# Altium footprint library HoangLong_Library.PcbLib: 81 footprints (part 4 of 6)
Each footprint in its own frame and in the unit in brackets; x right, y up, seen from the top. Pads: shape width x height; smd on the part's side, far side on the other; paste and mask are expansions set on the pad; w line width, h text height; cw(c..) or ccw(c..) is an arc to the next point about the centre after c.
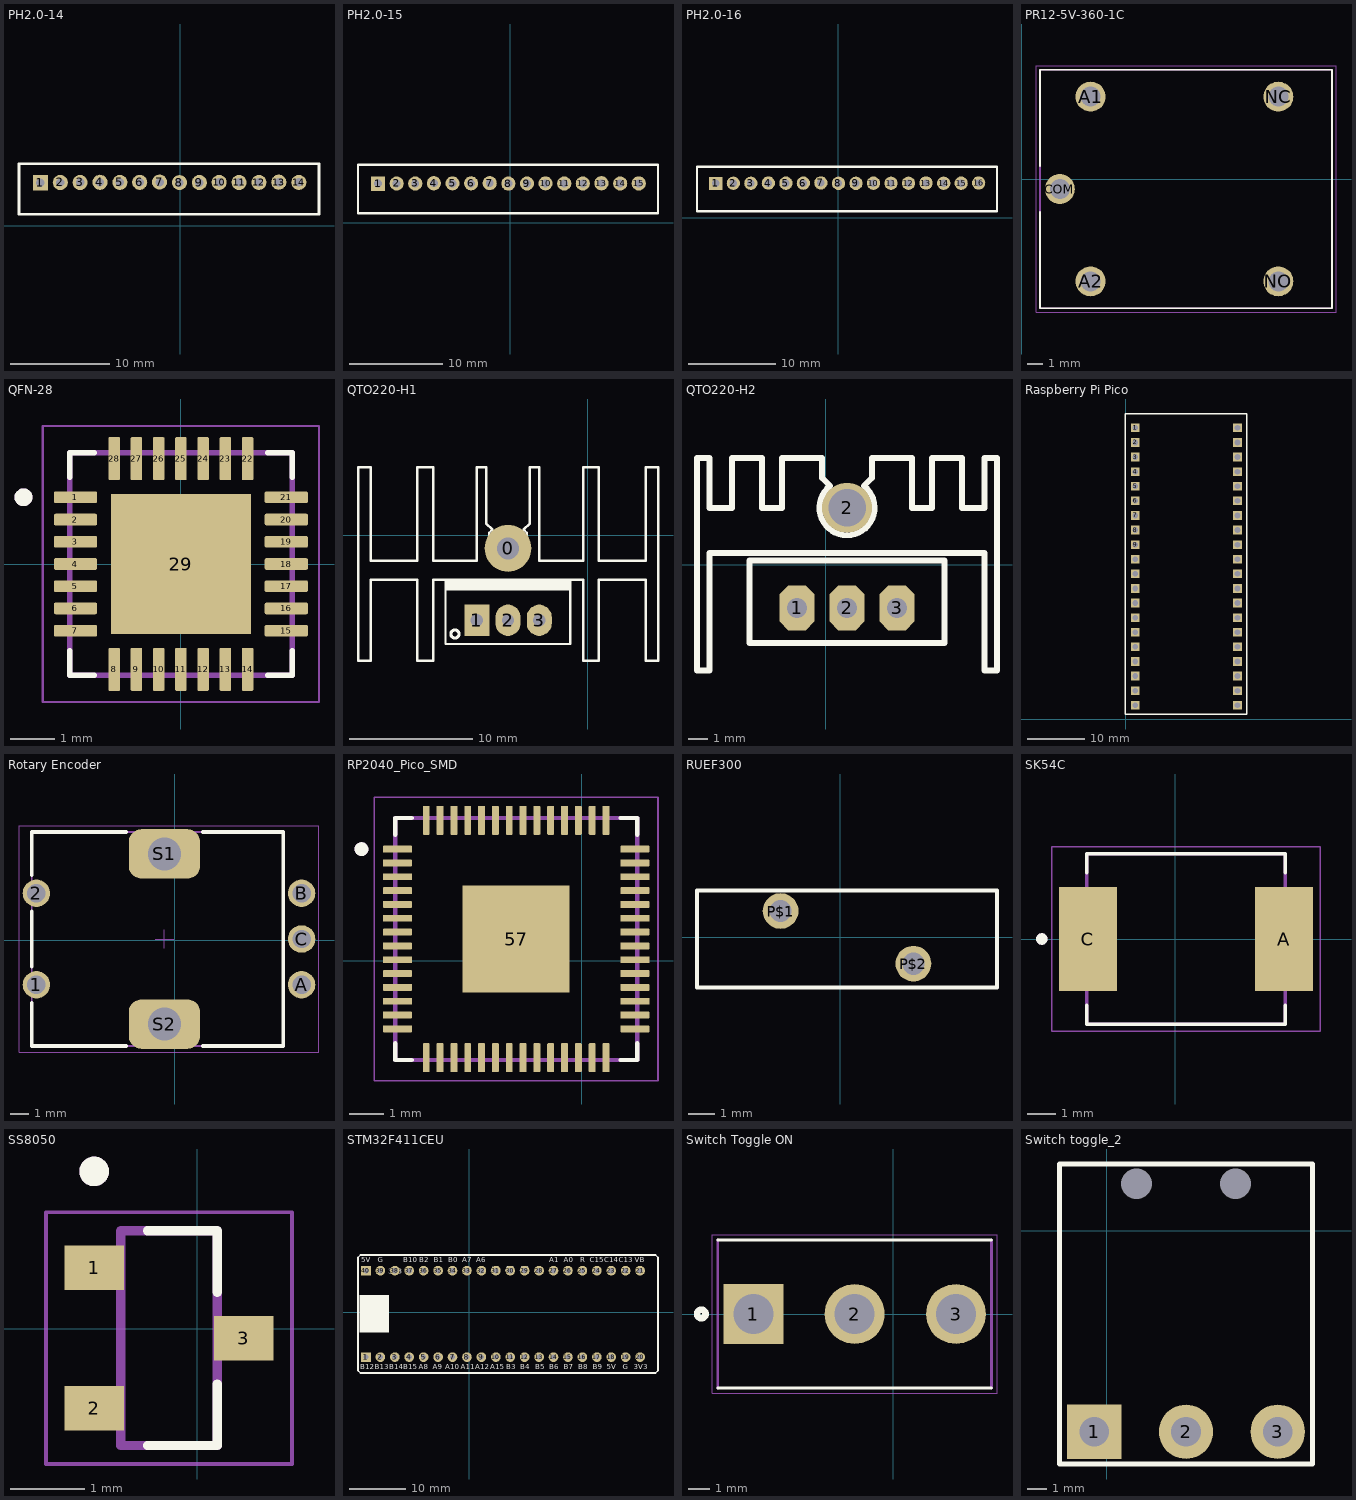
[diagram p3: the footprints below, top view; thin cyan lines are the x and y axes]

## PH2.0-14 [mil]
pads (14):
  rect 60x60 hole 33.46: 1(-555,170)
  round 60 hole 33.46: 2(-476.27,170.82) 3(-397.6,170.93) 4(-318.87,171.75) 5(-239.84,171.37) 6(-161.18,171.48) 7(-82.45,172.3) 8(-3.38,170.43) 9(75.29,170.53) 10(154.02,171.35) 11(233.05,170.98) 12(311.71,171.09) 13(390.44,171.91) 14(469.91,171.09)
Top Overlay:
  lines w10: -640,45 550,45 550,245 -640,245 -640,235 -640,45
3D body "JST - PH - Thru (V) - 14Pin - 2.00mm.stp": height 239.87, standoff -112.13, extent -632.81,52.93 542.81,236.93

## PH2.0-15 [mil]
pads (15):
  rect 60x60 hole 33.46: 1(-560,165)
  round 60 hole 33.46: 2(-481.27,165.82) 3(-402.6,165.93) 4(-323.87,166.75) 5(-244.84,166.37) 6(-166.18,166.48) 7(-87.45,167.3) 8(-8.38,165.43) 9(70.29,165.53) 10(149.02,166.35) 11(228.05,165.98) 12(306.71,166.09) 13(385.44,166.91) 14(464.91,166.09) 15(543.58,166.2)
Top Overlay:
  lines w10: -645,40 625,40 625,245 -645,245 -645,240 -645,40
3D body "JST - PH - Thru (V) - 15Pin - 2.00mm.stp": height 239.87, standoff -112.13, extent -638.34,48.25 616.02,232.25

## PH2.0-16 [mil]
pads (16):
  rect 60x60 hole 33.46: 1(-550,155)
  round 60 hole 33.46: 2(-471.27,155.82) 3(-392.6,155.93) 4(-313.87,156.75) 5(-234.84,156.37) 6(-156.18,156.48) 7(-77.45,157.3) 8(1.62,155.43) 9(80.29,155.53) 10(159.02,156.35) 11(238.05,155.98) 12(316.71,156.09) 13(395.44,156.91) 14(474.91,156.09) 15(553.58,156.2) 16(632.31,157.02)
Top Overlay:
  lines w10: -635,30 715,30 715,230 -635,230 -635,30
3D body "JST - PH - Thru (V) - 16Pin - 2.00mm.stp": height 239.87, standoff -112.13, extent -626.55,37.93 706.55,221.93

## PR12-5V-360-1C [mm]
pads (5):
  round 1.95 hole 1.3: A1(4.468,5.365) A2(4.468,-6.635) COM(2.468,-0.635) NC(16.668,5.365) NO(16.668,-6.635)
Top Overlay:
  lines w0.127: 1.168,-2.135 1.168,-8.385 20.168,-8.385 20.168,7.115 1.168,7.115 1.168,0.865
Mechanical 13:
  lines w0.127: 1.168,-8.385 1.168,7.115 20.168,7.115 20.168,-8.385 1.168,-8.385
Mechanical 15:
  lines w0.05: 0.918,-8.635 20.418,-8.635 20.418,7.365 0.918,7.365 0.918,-8.635
3D body "RELAY_SRD-05VDC.STEP": height 15.9, standoff -2.8, extent 1.068,-8.435 20.268,7.165

## QFN-28 [mm]
pads (29):
  rrect25% 0.97x0.26 smd: 1(-2.37,1.5) 2(-2.37,1) 3(-2.37,0.5) 4(-2.37,0) 5(-2.37,-0.5) 6(-2.37,-1) 7(-2.37,-1.5) 15(2.37,-1.5) 16(2.37,-1) 17(2.37,-0.5) 18(2.37,0) 19(2.37,0.5) 20(2.37,1) 21(2.37,1.5)
  rrect25% 0.26x0.97 smd: 8(-1.5,-2.37) 9(-1,-2.37) 10(-0.5,-2.37) 11(0,-2.37) 12(0.5,-2.37) 13(1,-2.37) 14(1.5,-2.37) 22(1.5,2.37) 23(1,2.37) 24(0.5,2.37) 25(0,2.37) 26(-0.5,2.37) 27(-1,2.37) 28(-1.5,2.37)
  rect 3.15x3.15 smd paste-0.575: 29(0,0)
Top Overlay:
  circle w0.2: c-3.54,1.5 r0.1
  lines w0.127: -2.5,-1.95 -2.5,-2.5 -1.95,-2.5 ; -2.5,1.95 -2.5,2.5 -1.95,2.5 ; 1.95,-2.5 2.5,-2.5 2.5,-1.95 ; 1.95,2.5 2.5,2.5 2.5,1.95
Mechanical 13:
  circle w0.2: c-3.54,1.5 r0.1
  lines w0.127: -2.5,-2.5 -2.5,2.5 2.5,2.5 2.5,-2.5 -2.5,-2.5
Mechanical 15:
  lines w0.05: -3.105,-3.105 -3.105,3.105 3.105,3.105 3.105,-3.105 -3.105,-3.105
3D body "CP2102.STEP": height 1, standoff 0, extent -2.5,-2.5 2.5,2.5

## QTO220-H1 [mil]
pads (4):
  round 150 hole 70: 0(-255,-42)
  rect 80x100 hole 39: 1(-355,-272)
  oval 80x100 hole 39: 2(-255,-272) 3(-155,-272)
Top Overlay:
  circle w10: c-424.97,-316 r12.97
  rectangle: -456,-177 -57,-141
  lines w7: -455,-172 -56.5,-172 -56,-179 ; -455,-347 -454,-348 -431,-348 -55,-348 -56,-347 -56,-142 -455,-142 -455,-347
  lines w8: -735,-402 -735,218 -695,218 -695,-82 -545,-82 -545,218 -495,218 -495,-82 -355,-82 -355,218 -325,218 -325,38 -305,18 -315,8 -315,-62 -295,-82 -215,-82 -195,-62 -195,8 -205,18 -185,38 -185,218 -155,218 -155,-82 -15,-82 -15,218 35,218 35,-82 185,-82 185,218 225,218 225,-402 185,-402 185,-142 35,-142 35,-402 -15,-402 -15,-142 -495,-142 -495,-402 -545,-402 -545,-142 -695,-142 -695,-402 -735,-402
3D body "User Library-TO-220-1.STEP": height 810.24, standoff -322.83, extent -449.76,-354.17 -60,-177
3D body "User Library-heat sink-1.STEP": height 1205.51, standoff 0, extent -703.79,-449 197.79,196.67

## QTO220-H2 [mil]
pads (4):
  oct 70x90 hole 40: 1(-57,-86) 2(43,-86) 3(143,-86)
  round 100 hole 75: 2(43,114)
Top Overlay:
  lines w12: 9,158 -7,174 -7,214 -87,214 -87,114 -127,114 -127,214 -187,214 -187,114 -232,114 -232,214 -257,214 -257,-211 -232,-211 -232,24 318,24 318,-211 343,-211 343,214 318,214 318,114 273,114 273,214 213,214 213,114 173,114 173,214 93,214 93,174 76.59,157.59 ; 9.37,157.52 ccw(c43,114) 76.77,157.41 ; -152,-156 238,-156 238,9 -152,9 -152,-156
3D body "User Library-TO-220-1.STEP": height 322.83, standoff -810.24, extent -153.88,-162.17 235.88,15
3D body "SW3dPS-heatsink TO126.STEP": height 984.25, standoff -149.61, extent -246.97,-188.25 334.97,237

## Raspberry Pi Pico [mil]
pads (40):
  rect 60x60 hole 39.37: 1(65,1995) 2(65,1895) 3(65,1795) 4(65,1695) 5(65,1595) 6(65,1495) 7(65,1395) 8(65,1295) 9(65,1195) 10(65,1095) 11(65,995) 12(65,895) 13(65,795) 14(65,695) 15(65,595) 16(65,495) 17(65,395) 18(65,295) 19(65,195) 20(65,95) 21(765,95) 22(765,195) 23(765,295) 24(765,395) 25(765,495) 26(765,595) 27(765,695) 28(765,795) 29(765,895) 30(765,995) 31(765,1095) 32(765,1195) 33(765,1295) 34(765,1395) 35(765,1495) 36(765,1595) 37(765,1695) 38(765,1795) 39(765,1895) 40(765,1995)
Top Overlay:
  lines w10: -5,35 830,35 830,2090 -5,2090 -5,35
3D body "raspberry pi pico with contacts.step": height 278.11, standoff -194.33, extent 0,39.37 826.77,2086.61

## Rotary Encoder [mm]
pads (7):
  round 1.5 hole 1: 1(-7.565,-2.445) 2(-7.565,2.555) A(6.935,-2.445) B(6.935,2.555) C(6.935,0.055)
  rrect50% 3.9x2.7 hole 1.8 square: S1(-0.565,4.705) S2(-0.565,-4.595)
Top Overlay:
  lines w0.2: -7.815,-3.445 -7.815,-5.795 -2.665,-5.795 ; -7.815,-1.445 -7.815,1.555 ; -7.815,3.555 -7.815,5.905 -2.665,5.905 ; 1.535,-5.795 5.935,-5.795 5.935,5.905 1.535,5.905
Top 3D Body:
  lines w0.1: -7.815,-5.795 5.935,-5.795 5.935,5.905 -7.815,5.905 -7.815,-5.795
Top Courtyard:
  lines w0.05: -1.065,0.055 -0.065,0.055 ; -0.565,-0.445 -0.565,0.555 ; -8.515,-6.145 7.885,-6.145 7.885,6.255 -8.515,6.255 -8.515,-6.145
Top Component Outline:
  lines w0.1: -7.815,-5.795 -7.815,5.905 5.935,5.905 5.935,-5.795 -7.815,-5.795
3D body "4820xx514001.stp": height 26.65, standoff -3.45, extent -7.865,-5.795 7.035,5.905

## RP2040_Pico_SMD [mm]
pads (57):
  rrect25% 0.84x0.2 smd: 1(-5.34,3.235) 2(-5.34,2.835) 3(-5.34,2.435) 4(-5.34,2.035) 5(-5.34,1.635) 6(-5.34,1.235) 7(-5.34,0.835) 8(-5.34,0.435) 9(-5.34,0.035) 10(-5.34,-0.365) 11(-5.34,-0.765) 12(-5.34,-1.165) 13(-5.34,-1.565) 14(-5.34,-1.965) 29(1.53,-1.965) 30(1.53,-1.565) 31(1.53,-1.165) 32(1.53,-0.765) 33(1.53,-0.365) 34(1.53,0.035) 35(1.53,0.435) 36(1.53,0.835) 37(1.53,1.235) 38(1.53,1.635) 39(1.53,2.035) 40(1.53,2.435) 41(1.53,2.835) 42(1.53,3.235)
  rrect25% 0.2x0.84 smd: 15(-4.505,-2.8) 16(-4.105,-2.8) 17(-3.705,-2.8) 18(-3.305,-2.8) 19(-2.905,-2.8) 20(-2.505,-2.8) 21(-2.105,-2.8) 22(-1.705,-2.8) 23(-1.305,-2.8) 24(-0.905,-2.8) 25(-0.505,-2.8) 26(-0.105,-2.8) 27(0.295,-2.8) 28(0.695,-2.8) 43(0.695,4.07) 44(0.295,4.07) 45(-0.105,4.07) 46(-0.505,4.07) 47(-0.905,4.07) 48(-1.305,4.07) 49(-1.705,4.07) 50(-2.105,4.07) 51(-2.505,4.07) 52(-2.905,4.07) 53(-3.305,4.07) 54(-3.705,4.07) 55(-4.105,4.07) 56(-4.505,4.07)
  rect 3.1x3.1 smd paste-0.57: 57(-1.905,0.635)
Top Overlay:
  circle w0.2: c-6.38,3.235 r0.1
  lines w0.127: -5.405,-2.385 -5.405,-2.865 -4.925,-2.865 ; -5.405,3.655 -5.405,4.135 -4.925,4.135 ; 1.115,-2.865 1.595,-2.865 1.595,-2.385 ; 1.115,4.135 1.595,4.135 1.595,3.655
Mechanical 13:
  circle w0.2: c-6.38,3.235 r0.1
  lines w0.127: -5.405,-2.865 1.595,-2.865 1.595,4.135 -5.405,4.135 -5.405,-2.865
Mechanical 15:
  lines w0.05: -6.01,-3.47 2.2,-3.47 2.2,4.74 -6.01,4.74 -6.01,-3.47
3D body "step_temp.STEP": height 0.9, standoff 0, extent -5.405,-2.865 1.595,4.135

## RUEF300 [mm]
pads (2):
  round 1.358 hole 0.85: P$1(-2.271,1) P$2(2.779,-1)
Top Overlay:
  lines w0.152: -5.446,-1.905 5.954,-1.905 5.954,1.778 -5.446,1.778 -5.446,-1.905
3D body "step_temp.STEP": height 16.5, standoff -7.6, extent -5.446,-1.5 5.954,1.5

## SK54C [mm] "Diode"
pads (2):
  rect 2x3.6 smd: A(3.781,0) C(-3.019,0)
Top Overlay:
  circle w0.2: c-4.619,0 r0.1
  lines w0.127: -3.056,-2.3 -3.056,-2.95 3.818,-2.95 3.818,-2.3 ; -3.056,2.3 -3.056,2.95 3.818,2.95 3.818,2.3
Mechanical 13:
  circle w0.2: c-4.619,0 r0.1
  lines w0.127: -3.056,-2.95 3.818,-2.95 3.818,2.95 -3.056,2.95 -3.056,-2.95
Mechanical 15:
  lines w0.05: -4.269,-3.2 5.031,-3.2 5.031,3.2 -4.269,3.2 -4.269,-3.2
3D body "step_temp.STEP": height 2.65, standoff 0, extent -3.594,-2.95 4.356,2.95

## SS8050 [mm]
pads (3):
  rect 0.8x0.6 smd: 1(-1.391,0.823) 2(-1.391,-1.077) 3(0.629,-0.127)
Top Overlay:
  circle w0.2: c-1.391,2.123 r0.1
  lines w0.127: -0.671,-1.577 0.269,-1.577 0.269,-0.747 ; -0.671,1.323 0.269,1.323 0.269,0.493
Mechanical 13:
  circle w0.2: c-1.391,2.123 r0.1
  lines w0.127: -1.031,-1.577 -1.031,1.323 0.269,1.323 0.269,-1.577 -1.031,-1.577
Mechanical 15:
  lines w0.05: -2.041,-1.827 1.279,-1.827 1.279,1.573 -2.041,1.573 -2.041,-1.827
3D body "SS8050-G--3DModel-STEP-1.STEP": height 1.14, standoff 0, extent -1.581,-1.575 0.819,1.321

## STM32F411CEU [mm]
pads (40):
  rect 1.7x1.7 hole 0.9: 1(-18.161,-7.925) 40(-18.161,7.29)
  round 1.7 hole 0.9: 2(-15.621,-7.925) 3(-13.081,-7.925) 4(-10.541,-7.925) 5(-8.001,-7.925) 6(-5.461,-7.925) 7(-2.921,-7.925) 8(-0.381,-7.925) 9(2.159,-7.925) 10(4.699,-7.925) 11(7.239,-7.925) 12(9.779,-7.925) 13(12.319,-7.925) 14(14.859,-7.925) 15(17.399,-7.925) 16(19.939,-7.925) 17(22.479,-7.925) 18(25.019,-7.925) 19(27.559,-7.925) 20(30.099,-7.925) 21(30.099,7.29) 22(27.559,7.29) 23(25.019,7.29) 24(22.479,7.29) 25(19.939,7.29) 26(17.399,7.29) 27(14.859,7.29) 28(12.319,7.29) 29(9.779,7.29) 30(7.239,7.29) 31(4.699,7.29) 32(2.159,7.29) 33(-0.381,7.29) 34(-2.921,7.29) 35(-5.461,7.29) 36(-8.001,7.29) 37(-10.541,7.29) 38(-13.081,7.29) 39(-15.621,7.29)
Top Overlay:
  rectangle: -19.304,-3.607 -14.097,3.023
  lines w0.305: -19.558,-10.287 -19.126,-10.719 32.817,-10.719 33.249,-10.287 33.249,9.627 32.815,10.06 -19.125,10.06 -19.558,9.627 -19.558,-10.287
  text "A11" at -1.448,-10.414 h1.52
  text "B1" at -6.223,8.458 h1.52
  text "A9" at -6.375,-10.414 h1.52
  text "B13" at -16.612,-10.414 h1.52
  text "C13" at 26.314,8.458 h1.52
  text "A10" at -4.191,-10.414 h1.52
  text "G" at 27.076,-10.414 h1.52
  text "B8" at 19.245,-10.414 h1.52
  text "5V" at -18.948,8.458 h1.52
  text "C15" at 21.234,8.458 h1.52
  text "B12" at -19.177,-10.414 h1.52
  text "A1" at 14.097,8.458 h1.52
  text "3V3" at -14.275,6.401 h1.52
  text "G" at -16.104,8.458 h1.52
  text "B10" at -11.582,8.458 h1.52
  text "A2" at 11.43,6.629 h1.52
  text "B15" at -11.582,-10.414 h1.52
  text "A6" at 1.27,8.458 h1.52
  text "B6" at 14.148,-10.414 h1.52
  text "A4" at 6.325,6.883 h1.52
  text "A15" at 3.683,-10.414 h1.52
  text "B2" at -8.814,8.458 h1.52
  text "B4" at 9,-10.414 h1.52
  text "A0" at 16.645,8.458 h1.52
  text "C14" at 23.8,8.458 h1.52
  text "A7" at -1.168,8.458 h1.52
  text "A12" at 1.118,-10.414 h1.52
  text "B0" at -3.632,8.458 h1.52
  text "A8" at -8.89,-10.414 h1.52
  text "B3" at 6.502,-10.414 h1.52
  text "A5" at 3.785,6.782 h1.52
  text "R" at 19.575,8.458 h1.52
  text "5V" at 24.258,-10.439 h1.52
  text "B7" at 16.696,-10.414 h1.52
  text "B9" at 21.793,-10.414 h1.52
  text "VB" at 29.159,8.458 h1.52
  text "B14" at -14.046,-10.414 h1.52
  text "A3" at 8.89,6.833 h1.52
  text "3V3" at 29.007,-10.414 h1.52
  text "B5" at 11.599,-10.414 h1.52
Bottom Overlay:
  lines w0.2: -19.431,-10.262 -19.431,-6.655 -17.526,-6.655 31.369,-6.655 31.369,-10.592 ; -19.431,9.728 -19.431,6.02 31.369,6.02 31.369,9.957
  text "C14" at 26.213,8.534 h1.52
  text "B14" at -11.684,-10.465 h1.52
  text "B3" at 8.052,-10.465 h1.52
  text "B1" at -4.801,8.534 h1.52
  text "A11" at 0.889,-10.465 h1.52
  text "G" at -15.138,8.534 h1.52
  text "5V" at 25.804,-10.452 h1.52
  text "B15" at -9.169,-10.465 h1.52
  text "G" at 28.448,-10.465 h1.52
  text "B0" at -2.083,8.534 h1.52
  text "B10" at -9.322,8.534 h1.52
  text "B12" at -16.866,-10.465 h1.52
  text "A3" at 10.668,8.534 h1.52
  text "3V3" at -12.014,8.534 h1.52
  text "B9" at 23.343,-10.465 h1.52
  text "VB" at 31.09,8.534 h1.52
  text "B5" at 13.081,-10.465 h1.52
  text "A2" at 13.233,8.534 h1.52
  text "A1" at 15.697,8.534 h1.52
  text "B13" at -14.275,-10.465 h1.52
  text "R" at 20.396,8.534 h1.52
  text "A10" at -1.727,-10.465 h1.52
  text "A12" at 3.556,-10.465 h1.52
  text "5V" at -17.323,8.534 h1.52
  text "A0" at 18.339,8.534 h1.52
  text "C15" at 23.647,8.534 h1.52
  text "A4" at 8.204,8.534 h1.52
  text "B2" at -7.239,8.534 h1.52
  text "B7" at 18.161,-10.465 h1.52
  text "A6" at 3.023,8.534 h1.52
  text "A15" at 6.147,-10.465 h1.52
  text "B4" at 10.595,-10.465 h1.52
  text "A9" at -4.648,-10.465 h1.52
  text "A8" at -7.137,-10.465 h1.52
  text "A7" at 0.432,8.534 h1.52
  text "3V3" at 30.963,-10.465 h1.52
  text "B8" at 20.726,-10.465 h1.52
  text "C13" at 28.702,8.534 h1.52
  text "B6" at 15.748,-10.465 h1.52
  text "A5" at 5.512,8.534 h1.52
3D body "Black Pill.step": height 9.66, standoff -3.76, extent -20.701,-10.414 35.939,9.906

## Switch Toggle ON [mil]
pads (3):
  rect 109.5x109.5 hole 73: 1(-255,0)
  round 109.5 hole 73: 2(-70,0) 3(115,0)
Top Overlay:
  circle w11.81: c-350,0.04 r7.87
  lines w5: -320,-135 180,-135 ; -320,135 180,135
Mechanical 13:
  lines w5: -320,-135 -320,135 ; 180,-135 180,135
Mechanical 15:
  lines w1.97: -329.84,-144.84 -329.84,144.84 189.84,144.84 189.84,-144.84 -329.84,-144.84
3D body "1-1825137-6.stp": height 1159.97, standoff -200, extent -320,-135 180,135

## Switch toggle_2 [mil]
pads (5):
  rect 109.5x109.5 hole 60 square: 1(-25,-405)
  round 109.5 hole 60: 2(160,-405) 3(345,-405)
  round 50 hole 62: ""(60,95) ""(260,95)
Top Overlay:
  lines w10: -95,-470 -95,135 415,135 415,-470 -95,-470
3D body "User Library-Switch toggle NKK M2012SA2W30.step": height 357.37, standoff -124.5, extent -95.07,-432.61 416.93,858.77